# Altium footprint library ERNI SMD.PcbLib: 26 footprints (part 2 of 2)
Each footprint in its own frame and in the unit in brackets; x right, y up, seen from the top. Pads: shape width x height; smd on the part's side, far side on the other; paste and mask are expansions set on the pad; w line width, h text height; cw(c..) or ccw(c..) is an arc to the next point about the centre after c.
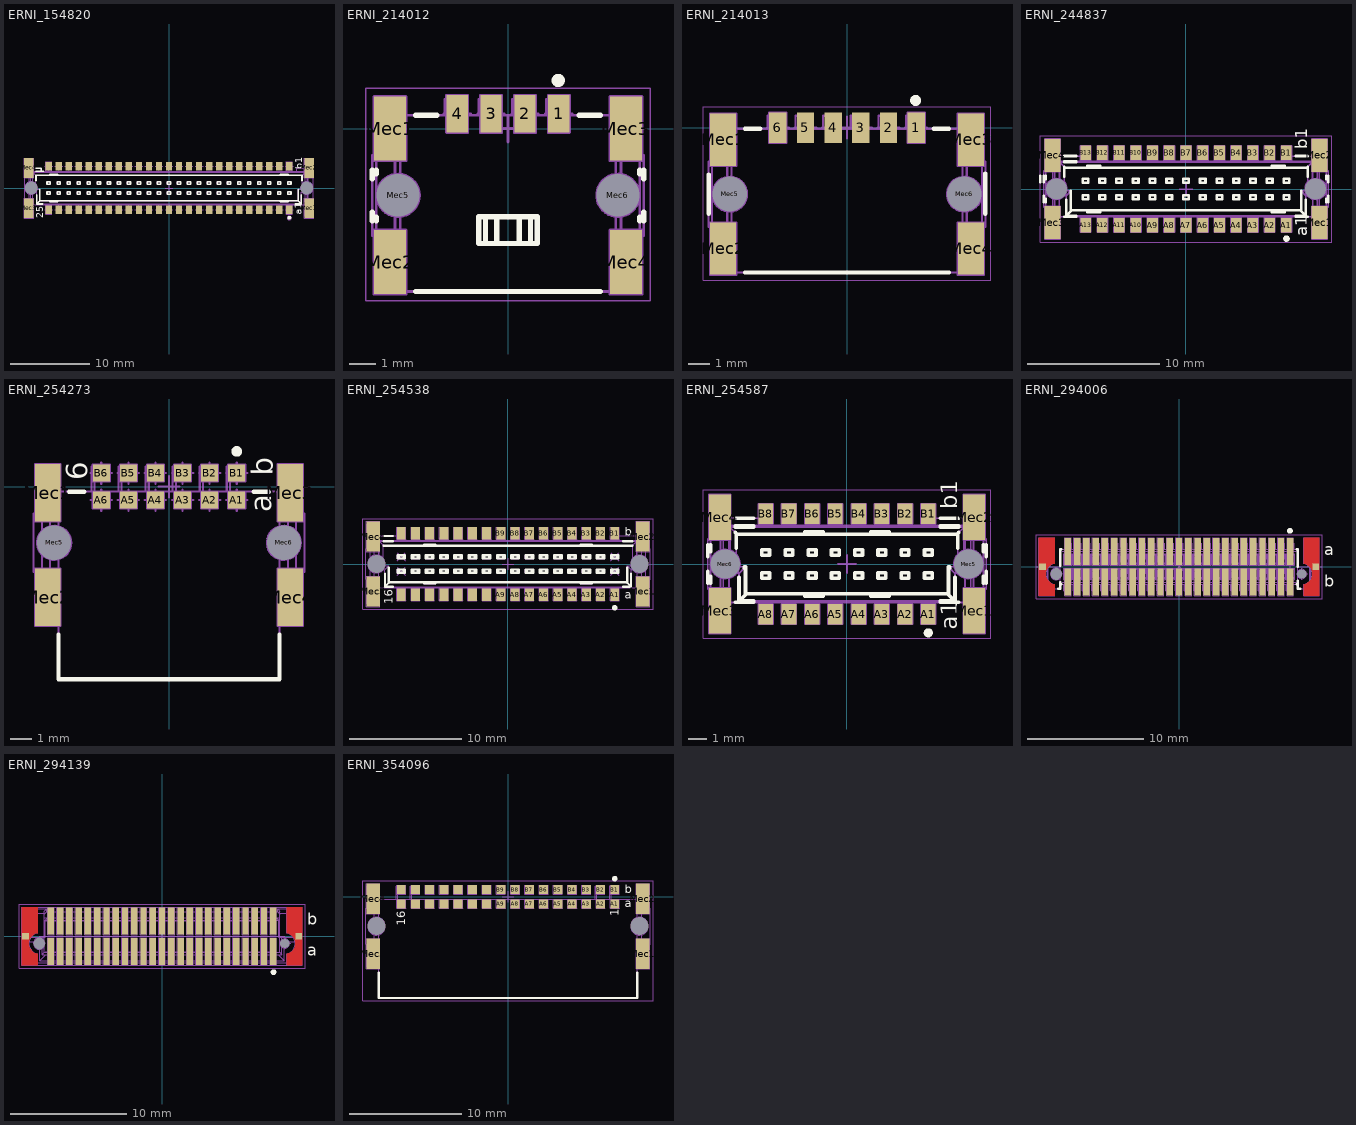
[diagram p1: the footprints below, top view; thin cyan lines are the x and y axes]

## ERNI_154820 [mm] "50 Contacts Pitch 1.27  SMC Straight Male Connector Type Q"
height 6.75
pads (56):
  rect 0.8x1.1 smd: A1(15.24,-2.75) A2(13.97,-2.75) A3(12.7,-2.75) A4(11.43,-2.75) A5(10.16,-2.75) A6(8.89,-2.75) A7(7.62,-2.75) A8(6.35,-2.75) A9(5.08,-2.75) A10(3.81,-2.75) A11(2.54,-2.75) A12(1.27,-2.75) A13(0,-2.75) A14(-1.27,-2.75) A15(-2.54,-2.75) A16(-3.81,-2.75) A17(-5.08,-2.75) A18(-6.35,-2.75) A19(-7.62,-2.75) A20(-8.89,-2.75) A21(-10.16,-2.75) A22(-11.43,-2.75) A23(-12.7,-2.75) A24(-13.97,-2.75) A25(-15.24,-2.75) B1(15.24,2.75) B2(13.97,2.75) B3(12.7,2.75) B4(11.43,2.75) B5(10.16,2.75) B6(8.89,2.75) B7(7.62,2.75) B8(6.35,2.75) B9(5.08,2.75) B10(3.81,2.75) B11(2.54,2.75) B12(1.27,2.75) B13(0,2.75) B14(-1.27,2.75) B15(-2.54,2.75) B16(-3.81,2.75) B17(-5.08,2.75) B18(-6.35,2.75) B19(-7.62,2.75) B20(-8.89,2.75) B21(-10.16,2.75) B22(-11.43,2.75) B23(-12.7,2.75) B24(-13.97,2.75) B25(-15.24,2.75)
  rect 1.2x2.5 smd: Mec1(17.752,-2.549) Mec2(17.752,2.549) Mec3(-17.752,-2.549) Mec4(-17.752,2.549)
  round 1 hole 1.6 unplated mask+0.3: Mec5(17.452,0) Mec6(-17.453,0)
Top Overlay:
  drawing of 229 lines, arcs and shapes, not listed
  text "25" at -15.95,-3.825 h0.9
  text "a1" at 16.828,-3.4 h0.9
  text "b1" at 16.852,2.4 h0.9
Mechanical 8:
  drawing of 262 lines, arcs and shapes, not listed
Mechanical 14:
  drawing of 291 lines, arcs and shapes, not listed
  text "b1" at 16.852,2.4 h0.9
  text "a1" at 16.825,-3.4 h0.9
  text "25" at -15.95,-3.825 h0.9
3D body "ERNI_154820.stp": height 6.75, standoff -0.75, extent -18.417,-3.6 18.403,3.6

## ERNI_214012 [mm] "4 Contacts, 1.27mm, Type A, Single Row Right Angle Male Connector, MiniBridge Cable System"
height 2.98
pads (10):
  rect 0.8x1.4 smd: 1(1.905,0.55) 2(0.635,0.55) 3(-0.635,0.55) 4(-1.905,0.55)
  rect 1.2x2.4 smd: Mec1(-4.415,0) Mec2(-4.415,-5) Mec3(4.415,0) Mec4(4.415,-5)
  round 1 hole 1.6 unplated mask+0.3: Mec5(-4.115,-2.5) Mec6(4.115,-2.5)
Top Overlay:
  circle w0.25: c1.88,1.8 r0.125
  lines w0.2: -5.08,-3.45 -5.08,-3.126 ; -5.08,-1.874 -5.08,-1.55 ; -4.93,-3.45 -4.93,-3.311 ; -4.93,-1.689 -4.93,-1.55 ; -3.465,-6.1 3.465,-6.1 ; -3.465,0.5 -2.655,0.5 ; -0.845,-4.3 -0.845,-3.3 ; -0.425,-4.3 -0.425,-3.3 ; 0.425,-4.3 0.425,-3.3 ; 0.845,-4.3 0.845,-3.3 ; 2.655,0.5 3.465,0.5 ; 4.93,-3.45 4.93,-3.311 ; 4.93,-1.689 4.93,-1.55 ; 5.08,-3.45 5.08,-3.126 ; 5.08,-1.874 5.08,-1.55 ; -1.1,-4.3 1.1,-4.3 1.1,-3.3 -1.1,-3.3 -1.1,-4.3
Mechanical 8:
  circle w0.1: c4.115,-2.5 r0.8
  circle w0.1: c-4.115,-2.5 r0.8
  lines w0.1: -4.915,-5 -4.415,-5 ; -4.915,0 -4.415,0 ; -4.615,-2.5 -4.115,-2.5 ; -4.415,-5.5 -4.415,-5 ; -4.415,-4.5 -4.415,-5 ; -4.415,-0.5 -4.415,0 ; -4.415,0.5 -4.415,0 ; -4.115,-3 -4.115,-2.5 ; -4.115,-2 -4.115,-2.5 ; -3.915,-5 -4.415,-5 ; -3.915,0 -4.415,0 ; -3.615,-2.5 -4.115,-2.5 ; -2.405,0.55 -1.905,0.55 ; -1.905,0.05 -1.905,0.55 ; -1.905,1.05 -1.905,0.55 ; -1.405,0.55 -1.905,0.55 ; -1.135,0.55 -0.635,0.55 ; -0.635,0.05 -0.635,0.55 ; -0.635,1.05 -0.635,0.55 ; -0.5,0 0,0 ; -0.135,0.55 -0.635,0.55 ; 0,-0.5 0,0 ; 0,0.5 0,0 ; 0.135,0.55 0.635,0.55 ; 0.5,0 0,0 ; 0.635,0.05 0.635,0.55 ; 0.635,1.05 0.635,0.55 ; 1.135,0.55 0.635,0.55 ; 1.405,0.55 1.905,0.55 ; 1.905,0.05 1.905,0.55 ; 1.905,1.05 1.905,0.55 ; 2.405,0.55 1.905,0.55 ; 3.615,-2.5 4.115,-2.5 ; 3.915,-5 4.415,-5 ; 3.915,0 4.415,0 ; 4.115,-3 4.115,-2.5 ; 4.115,-2 4.115,-2.5 ; 4.415,-5.5 4.415,-5 ; 4.415,-4.5 4.415,-5 ; 4.415,-0.5 4.415,0 ; 4.415,0.5 4.415,0 ; 4.615,-2.5 4.115,-2.5 ; 4.915,-5 4.415,-5 ; 4.915,0 4.415,0 ; -5.015,-6.2 -3.815,-6.2 -3.815,-3.8 -5.015,-3.8 -5.015,-6.2 ; -5.015,-1.2 -3.815,-1.2 -3.815,1.2 -5.015,1.2 -5.015,-1.2 ; -2.305,-0.15 -1.505,-0.15 -1.505,1.25 -2.305,1.25 -2.305,-0.15 ; -1.035,-0.15 -0.235,-0.15 -0.235,1.25 -1.035,1.25 -1.035,-0.15 ; 0.235,-0.15 1.035,-0.15 1.035,1.25 0.235,1.25 0.235,-0.15 ; 1.505,-0.15 2.305,-0.15 2.305,1.25 1.505,1.25 1.505,-0.15 ; 3.815,-6.2 5.015,-6.2 5.015,-3.8 3.815,-3.8 3.815,-6.2 ; 3.815,-1.2 5.015,-1.2 5.015,1.2 3.815,1.2 3.815,-1.2
Mechanical 14:
  lines w0.1: -4.93,-5.38 -4.63,-5.38 ; -4.93,-4.55 -4.23,-4.55 -4.23,-0.45 -4.93,-0.45 ; -4.93,-4 -5.08,-4 -5.08,-1 -4.93,-1 ; -4.93,0.38 -4.63,0.38 ; -4.63,-6 -4.93,-6 -4.93,1 -3.93,1 -3.93,0.5 ; -4.63,-4.55 -4.63,-6.1 4.63,-6.1 4.63,-4.55 ; -4.63,-0.45 -4.63,0.5 4.63,0.5 4.63,-0.45 ; -4.03,-6.1 -4.03,0.5 ; -2.37,0.5 -2.37,1.1 -1.65,1.1 -1.65,0.5 ; -2.22,0.5 -2.22,1.1 ; -1.1,0.5 -1.1,1.1 -0.38,1.1 -0.38,0.5 ; -0.95,0.5 -0.95,1.1 ; -0.845,-4.3 -0.845,-3.3 ; -0.425,-4.3 -0.425,-3.3 ; 0.17,0.5 0.17,1.1 0.89,1.1 0.89,0.5 ; 0.32,0.5 0.32,1.1 ; 0.425,-4.3 0.425,-3.3 ; 0.845,-4.3 0.845,-3.3 ; 1.44,0.5 1.44,1.1 2.16,1.1 2.16,0.5 ; 1.59,0.5 1.59,1.1 ; 3.93,0.5 3.93,1 4.93,1 4.93,-6 4.63,-6 ; 4.03,-6.1 4.03,0.5 ; 4.63,-5.38 4.93,-5.38 ; 4.63,0.38 4.93,0.38 ; 4.93,-4.55 4.23,-4.55 4.23,-0.45 4.93,-0.45 ; 4.93,-4 5.08,-4 5.08,-1 4.93,-1 ; -1.1,-4.3 1.1,-4.3 1.1,-3.3 -1.1,-3.3 -1.1,-4.3
Mechanical 15:
  lines w0.05: -5.33,-6.45 5.33,-6.45 5.33,1.5 -5.33,1.5 -5.33,-6.45
3D body "ERNI_214012.stp": height 2.98, standoff -0.75, extent -5.08,-6.1 5.08,1.1

## ERNI_214013 [mm] "6 Contacts, 1.27mm SRC Type A, Single Row Right Angle Male Connector, MiniBridge Cable System"
height 2.98
pads (12):
  rect 0.8x1.4 smd: 1(3.175,0) 2(1.905,0) 3(0.635,0) 4(-0.635,0) 5(-1.905,0) 6(-3.175,0)
  rect 1.2x2.4 smd: Mec1(-5.685,-0.55) Mec2(-5.685,-5.55) Mec3(5.685,-0.55) Mec4(5.685,-5.55)
  round 1 hole 1.6 unplated mask+0.3: Mec5(-5.385,-3.05) Mec6(5.385,-3.05)
Top Overlay:
  circle w0.25: c3.15,1.25 r0.125
  lines w0.2: -6.35,-3.95 -6.35,-2.15 ; -4.685,-6.65 4.685,-6.65 ; -4.685,-0.05 -3.975,-0.05 ; 3.975,-0.05 4.685,-0.05 ; 6.35,-3.95 6.35,-2.1
Mechanical 8:
  circle w0.1: c-5.385,-3.05 r0.8
  circle w0.1: c5.385,-3.05 r0.8
  lines w0.1: -6.185,-5.55 -5.685,-5.55 ; -6.185,-0.55 -5.685,-0.55 ; -5.885,-3.05 -5.385,-3.05 ; -5.685,-6.05 -5.685,-5.55 ; -5.685,-5.05 -5.685,-5.55 ; -5.685,-1.05 -5.685,-0.55 ; -5.685,-0.05 -5.685,-0.55 ; -5.385,-3.55 -5.385,-3.05 ; -5.385,-2.55 -5.385,-3.05 ; -5.185,-5.55 -5.685,-5.55 ; -5.185,-0.55 -5.685,-0.55 ; -4.885,-3.05 -5.385,-3.05 ; -3.675,0 -3.175,0 ; -3.175,-0.5 -3.175,0 ; -3.175,0.5 -3.175,0 ; -2.675,0 -3.175,0 ; -2.405,0 -1.905,0 ; -1.905,-0.5 -1.905,0 ; -1.905,0.5 -1.905,0 ; -1.405,0 -1.905,0 ; -1.135,0 -0.635,0 ; -0.635,-0.5 -0.635,0 ; -0.635,0.5 -0.635,0 ; -0.5,0 0,0 ; 0,-0.5 0,0 ; 0,0.5 0,0 ; 0.5,0 0,0 ; 0.635,-0.5 0.635,0 ; 0.635,0.5 0.635,0 ; 1.135,0 0.635,0 ; 1.405,0 1.905,0 ; 1.905,-0.5 1.905,0 ; 1.905,0.5 1.905,0 ; 2.405,0 1.905,0 ; 2.675,0 3.175,0 ; 3.175,-0.5 3.175,0 ; 3.175,0.5 3.175,0 ; 3.675,0 3.175,0 ; 4.885,-3.05 5.385,-3.05 ; 5.185,-5.55 5.685,-5.55 ; 5.185,-0.55 5.685,-0.55 ; 5.385,-3.55 5.385,-3.05 ; 5.385,-2.55 5.385,-3.05 ; 5.685,-6.05 5.685,-5.55 ; 5.685,-5.05 5.685,-5.55 ; 5.685,-1.05 5.685,-0.55 ; 5.685,-0.05 5.685,-0.55 ; 5.885,-3.05 5.385,-3.05 ; 6.185,-5.55 5.685,-5.55 ; 6.185,-0.55 5.685,-0.55 ; -6.285,-6.75 -5.085,-6.75 -5.085,-4.35 -6.285,-4.35 -6.285,-6.75 ; -6.285,-1.75 -5.085,-1.75 -5.085,0.65 -6.285,0.65 -6.285,-1.75 ; -3.575,-0.7 -3.575,0.7 -2.775,0.7 -2.775,-0.7 -3.575,-0.7 ; 2.775,-0.7 2.775,0.7 3.575,0.7 3.575,-0.7 2.775,-0.7 ; 5.085,-6.75 6.285,-6.75 6.285,-4.35 5.085,-4.35 5.085,-6.75 ; 5.085,-1.75 5.085,0.65 6.285,0.65 6.285,-1.75 5.085,-1.75
Mechanical 14:
  lines w0.1: -6.203,-4.55 -6.35,-4.55 -6.35,-1.55 -6.196,-1.55 ; -6.2,-5.1 -5.5,-5.1 -5.5,-1 -6.2,-1 ; -5.9,-6.18 -6.2,-6.18 -6.2,-6.65 -5.9,-6.65 ; -5.9,-5.93 -6.2,-5.93 -6.2,-0.17 -5.9,-0.17 ; -5.9,-5.1 -5.9,-6.65 ; -5.9,-1 -5.9,-0.05 5.9,-0.05 5.9,-1 ; -5.85,-0.05 -5.85,0.08 -6.2,0.08 -6.2,0.55 -5.2,0.55 -5.2,-0.05 ; -5.3,-6.65 -5.3,-0.05 ; -3.64,-0.05 -3.64,0.55 -3.02,0.55 cw(c-3.02,0.45) -2.92,0.45 -2.92,-0.05 ; -3.49,-0.05 -3.49,0.55 ; -2.37,-0.05 -2.37,0.55 -1.75,0.55 cw(c-1.75,0.45) -1.65,0.45 -1.65,-0.05 ; -2.22,-0.05 -2.22,0.55 ; -1.1,-0.05 -1.1,0.55 -0.48,0.55 cw(c-0.48,0.45) -0.38,0.45 -0.38,-0.05 ; -0.95,-0.05 -0.95,0.55 ; 0.17,-0.05 0.17,0.55 0.79,0.55 cw(c0.79,0.45) 0.89,0.45 0.89,-0.05 ; 0.32,-0.05 0.32,0.55 ; 1.44,-0.05 1.44,0.55 2.06,0.55 cw(c2.06,0.45) 2.16,0.45 2.16,-0.05 ; 1.59,-0.05 1.59,0.55 ; 2.71,-0.05 2.71,0.55 3.33,0.55 cw(c3.33,0.45) 3.43,0.45 3.43,-0.05 ; 2.86,-0.05 2.86,0.55 ; 5.2,-0.05 5.2,0.55 6.2,0.55 6.2,0.08 5.85,0.08 5.85,-0.05 ; 5.3,-6.65 5.3,-0.05 ; 5.9,-6.18 6.2,-6.18 6.2,-6.65 5.9,-6.65 ; 5.9,-5.93 6.2,-5.93 6.2,-0.17 5.9,-0.17 ; 5.9,-5.1 5.9,-6.65 ; 6.196,-1.55 6.35,-1.55 6.35,-4.55 6.203,-4.55 ; 6.2,-5.1 5.5,-5.1 5.5,-1 6.2,-1 ; -5.9,-6.65 5.9,-6.65
Mechanical 15:
  lines w0.05: -6.604,-7.004 -6.604,0.954 6.604,0.954 6.604,-7.004 -6.604,-7.004
3D body "ERNI_214013.stp": height 2.98, standoff -0.75, extent -6.35,-6.65 6.35,0.55

## ERNI_244837 [mm] "26 Contacts Pitch 1.27, SMC Straight Male Connector Type Q"
height 7.6
pads (32):
  rect 0.8x1.1 smd: A1(7.62,-2.75) A2(6.35,-2.75) A3(5.08,-2.75) A4(3.81,-2.75) A5(2.54,-2.75) A6(1.27,-2.75) A7(0,-2.75) A8(-1.27,-2.75) A9(-2.54,-2.75) A10(-3.81,-2.75) A11(-5.08,-2.75) A12(-6.35,-2.75) A13(-7.62,-2.75) B1(7.62,2.75) B2(6.35,2.75) B3(5.08,2.75) B4(3.81,2.75) B5(2.54,2.75) B6(1.27,2.75) B7(0,2.75) B8(-1.27,2.75) B9(-2.54,2.75) B10(-3.81,2.75) B11(-5.08,2.75) B12(-6.35,2.75) B13(-7.62,2.75)
  rect 1.2x2.5 smd: Mec1(10.13,-2.55) Mec2(10.13,2.55) Mec3(-10.13,-2.55) Mec4(-10.13,2.55)
  round 1 hole 1.6 unplated mask+0.3: Mec5(9.83,0) Mec6(-9.83,0)
Top Overlay:
  drawing of 156 lines, arcs and shapes, not listed
  text "a1" at 9.2,-3.6 h0.9
  text "b1" at 9.2,3 h0.9
Mechanical 8:
  drawing of 194 lines, arcs and shapes, not listed
Mechanical 14:
  drawing of 440 lines, arcs and shapes, not listed
  text "a1" at 9.2,-3.6 h0.9
  text "13" at -8.303,-3.775 h0.9
Mechanical 15:
  lines w0.05: -11.045,-4.05 -11.045,4.05 11.045,4.05 11.045,-4.05 -11.045,-4.05
3D body "ERNI_244837.stp": height 6.75, standoff -0.75, extent -10.795,-3.5 10.795,3.5

## ERNI_254273 [mm] "12 Contacts, Pitch 1.27, SMC Right Angle Male Connector Type B"
height 4.2
pads (18):
  rect 0.8x0.8 smd: A1(3.175,-0.635) A2(1.905,-0.635) A3(0.635,-0.635) A4(-0.635,-0.635) A5(-1.905,-0.635) A6(-3.175,-0.635) B1(3.175,0.635) B2(1.905,0.635) B3(0.635,0.635) B4(-0.635,0.635) B5(-1.905,0.635) B6(-3.175,0.635)
  rect 1.2x2.7 smd: Mec1(-5.685,-0.285) Mec2(-5.685,-5.185) Mec3(5.685,-0.285) Mec4(5.685,-5.185)
  round 1 hole 1.6 unplated mask+0.3: Mec5(-5.385,-2.635) Mec6(5.385,-2.635)
Top Overlay:
  circle w0.25: c3.175,1.651 r0.125
  lines w0.2: -5.185,-6.935 -5.185,-9.035 5.185,-9.035 5.185,-6.935 ; -4.685,-0.235 -3.975,-0.235 ; 3.975,-0.235 4.685,-0.235
  text "b" at 4.855,0.5 h1
  text "a" at 4.8,-1.2 h1
  text "6" at -3.845,0.3 h1
Mechanical 8:
  circle w0.1: c-5.385,-2.635 r0.8
  circle w0.1: c5.385,-2.635 r0.8
  lines w0.1: -6.185,-5.185 -5.685,-5.185 ; -6.185,-0.285 -5.685,-0.285 ; -5.885,-2.635 -5.385,-2.635 ; -5.685,-5.685 -5.685,-5.185 ; -5.685,-4.685 -5.685,-5.185 ; -5.685,-0.785 -5.685,-0.285 ; -5.685,0.215 -5.685,-0.285 ; -5.385,-3.135 -5.385,-2.635 ; -5.385,-2.135 -5.385,-2.635 ; -5.185,-5.185 -5.685,-5.185 ; -5.185,-0.285 -5.685,-0.285 ; -4.885,-2.635 -5.385,-2.635 ; -3.675,-0.635 -3.175,-0.635 ; -3.675,0.635 -3.175,0.635 ; -3.175,-1.135 -3.175,-0.635 ; -3.175,-0.135 -3.175,-0.635 ; -3.175,0.135 -3.175,0.635 ; -3.175,1.135 -3.175,0.635 ; -2.675,-0.635 -3.175,-0.635 ; -2.675,0.635 -3.175,0.635 ; -2.405,-0.635 -1.905,-0.635 ; -2.405,0.635 -1.905,0.635 ; -1.905,-1.135 -1.905,-0.635 ; -1.905,-0.135 -1.905,-0.635 ; -1.905,0.135 -1.905,0.635 ; -1.905,1.135 -1.905,0.635 ; -1.405,-0.635 -1.905,-0.635 ; -1.405,0.635 -1.905,0.635 ; -1.135,-0.635 -0.635,-0.635 ; -1.135,0.635 -0.635,0.635 ; -0.635,-1.135 -0.635,-0.635 ; -0.635,-0.135 -0.635,-0.635 ; -0.635,0.135 -0.635,0.635 ; -0.635,1.135 -0.635,0.635 ; -0.5,0 0,0 ; -0.135,-0.635 -0.635,-0.635 ; -0.135,0.635 -0.635,0.635 ; 0,-0.5 0,0 ; 0,0.5 0,0 ; 0.135,-0.635 0.635,-0.635 ; 0.135,0.635 0.635,0.635 ; 0.5,0 0,0 ; 0.635,-1.135 0.635,-0.635 ; 0.635,-0.135 0.635,-0.635 ; 0.635,0.135 0.635,0.635 ; 0.635,1.135 0.635,0.635 ; 1.135,-0.635 0.635,-0.635 ; 1.135,0.635 0.635,0.635 ; 1.405,-0.635 1.905,-0.635 ; 1.405,0.635 1.905,0.635 ; 1.905,-1.135 1.905,-0.635 ; 1.905,-0.135 1.905,-0.635 ; 1.905,0.135 1.905,0.635 ; 1.905,1.135 1.905,0.635 ; 2.405,-0.635 1.905,-0.635 ; 2.405,0.635 1.905,0.635 ; 2.675,-0.635 3.175,-0.635 ; 2.675,0.635 3.175,0.635 ; 3.175,-1.135 3.175,-0.635 ; 3.175,-0.135 3.175,-0.635 ; 3.175,0.135 3.175,0.635 ; 3.175,1.135 3.175,0.635 ; 3.675,-0.635 3.175,-0.635 ; 3.675,0.635 3.175,0.635 ; 4.885,-2.635 5.385,-2.635 ; 5.185,-5.185 5.685,-5.185 ; 5.185,-0.285 5.685,-0.285 ; 5.385,-3.135 5.385,-2.635 ; 5.385,-2.135 5.385,-2.635 ; 5.685,-5.685 5.685,-5.185 ; 5.685,-4.685 5.685,-5.185 ; 5.685,-0.785 5.685,-0.285 ; 5.685,0.215 5.685,-0.285 ; 5.885,-2.635 5.385,-2.635 ; 6.185,-5.185 5.685,-5.185 ; 6.185,-0.285 5.685,-0.285 ; -6.285,-6.535 -5.085,-6.535 -5.085,-3.835 -6.285,-3.835 -6.285,-6.535 ; -6.285,-1.635 -6.285,1.065 -5.085,1.065 -5.085,-1.635 -6.285,-1.635 ; -3.575,-1.035 -2.775,-1.035 -2.775,-0.235 -3.575,-0.235 -3.575,-1.035 ; -3.575,0.235 -2.775,0.235 -2.775,1.035 -3.575,1.035 -3.575,0.235 ; -2.305,-1.035 -1.505,-1.035 -1.505,-0.235 -2.305,-0.235 -2.305,-1.035 ; -2.305,0.235 -1.505,0.235 -1.505,1.035 -2.305,1.035 -2.305,0.235 ; -1.035,-1.035 -0.235,-1.035 -0.235,-0.235 -1.035,-0.235 -1.035,-1.035 ; -1.035,0.235 -0.235,0.235 -0.235,1.035 -1.035,1.035 -1.035,0.235 ; 0.235,-1.035 1.035,-1.035 1.035,-0.235 0.235,-0.235 0.235,-1.035 ; 0.235,0.235 1.035,0.235 1.035,1.035 0.235,1.035 0.235,0.235 ; 1.505,-1.035 2.305,-1.035 2.305,-0.235 1.505,-0.235 1.505,-1.035 ; 1.505,0.235 2.305,0.235 2.305,1.035 1.505,1.035 1.505,0.235 ; 2.775,-1.035 3.575,-1.035 3.575,-0.235 2.775,-0.235 2.775,-1.035 ; 2.775,0.235 3.575,0.235 3.575,1.035 2.775,1.035 2.775,0.235 ; 5.085,-6.535 6.285,-6.535 6.285,-3.835 5.085,-3.835 5.085,-6.535 ; 5.085,-1.635 5.085,1.065 6.285,1.065 6.285,-1.635 5.085,-1.635
Mechanical 14:
  drawing of 628 lines, arcs and shapes, not listed
  text "a" at 4.8,-1.2 h1
  text "b" at 4.855,0.5 h1
  text "a1" at 2.7,-2.8 h1
  text "a6" at -4,-2.8 h1
  text "6" at -3.845,0.3 h1
3D body "ERNI_254273.stp": height 4.25, standoff -0.75, extent -6.35,-9.035 6.35,0.965

## ERNI_254538 [mm] "32 Contacts Pitch 1.27, SMC Straight Male Connector Type Q"
height 8.25
pads (38):
  rect 0.8x1.1 smd: A1(9.525,-2.75) A2(8.255,-2.75) A3(6.985,-2.75) A4(5.715,-2.75) A5(4.445,-2.75) A6(3.175,-2.75) A7(1.905,-2.75) A8(0.635,-2.75) A9(-0.635,-2.75) A10(-1.905,-2.75) A11(-3.175,-2.75) A12(-4.445,-2.75) A13(-5.715,-2.75) A14(-6.985,-2.75) A15(-8.255,-2.75) A16(-9.525,-2.75) B1(9.525,2.75) B2(8.255,2.75) B3(6.985,2.75) B4(5.715,2.75) B5(4.445,2.75) B6(3.175,2.75) B7(1.905,2.75) B8(0.635,2.75) B9(-0.635,2.75) B10(-1.905,2.75) B11(-3.175,2.75) B12(-4.445,2.75) B13(-5.715,2.75) B14(-6.985,2.75) B15(-8.255,2.75) B16(-9.525,2.75)
  rect 1.2x2.7 smd: Mec1(12.035,-2.45) Mec2(12.035,2.45) Mec3(-12.035,-2.45) Mec4(-12.035,2.45)
  round 1 hole 1.6 unplated mask+0.3: Mec5(11.735,0) Mec6(-11.735,0)
Top Overlay:
  drawing of 218 lines, arcs and shapes, not listed
  text "16" at -10.3,-3.6 h0.75
  text "a" at 10.4,-3.1 h0.75
  text "b" at 10.4,2.5 h0.75
Mechanical 8:
  drawing of 254 lines, arcs and shapes, not listed
Mechanical 14:
  drawing of 496 lines, arcs and shapes, not listed
  text "16" at -10.3,-3.6 h0.75
  text "b" at 10.4,2.5 h0.75
  text "a" at 10.4,-3.1 h0.75
Mechanical 15:
  lines w0.05: -12.95,-4.05 12.95,-4.05 12.95,4.05 -12.95,4.05 -12.95,-4.05
3D body "ERNI_254538.stp": height 8.25, standoff -0.75, extent -12.7,-3.6 12.7,3.6

## ERNI_254587 [mm] "16 Contacts Pitch 1.27, SMC Straight Male Connector Type Q"
height 7.6
pads (22):
  rect 0.8x1.1 smd: A1(4.445,-2.75) A2(3.175,-2.75) A3(1.905,-2.75) A4(0.635,-2.75) A5(-0.635,-2.75) A6(-1.905,-2.75) A7(-3.175,-2.75) A8(-4.445,-2.75) B1(4.445,2.75) B2(3.175,2.75) B3(1.905,2.75) B4(0.635,2.75) B5(-0.635,2.75) B6(-1.905,2.75) B7(-3.175,2.75) B8(-4.445,2.75)
  rect 1.2x2.5 smd: Mec1(6.955,-2.55) Mec2(6.955,2.55) Mec3(-6.955,-2.55) Mec4(-6.955,2.55)
  round 1 hole 1.6 unplated mask+0.3: Mec5(6.655,0) Mec6(-6.655,0)
Top Overlay:
  circle w0.25: c4.447,-3.766 r0.125
  lines w0.2: -7.62,-1.05 -7.62,-0.414 ; -7.62,0.414 -7.62,1.05 ; -7.47,-1.05 -7.47,-0.662 ; -7.47,0.662 -7.47,1.05 ; -6.105,-2.1 -5.095,-2.1 ; -6.105,1.725 -6.055,1.675 -6.055,0.862 ; -6.105,2.025 -5.095,2.025 ; -6.105,2.1 -5.095,2.1 ; -6.105,2.5 -5.095,2.5 ; -6.055,1.625 -2.3,1.625 ; -5.905,-0.735 -5.905,-2.025 ; -5.629,-0.224 -5.555,-0.15 ; -5.616,-0.15 -5.555,-0.15 ; -5.555,-1.625 -2.3,-1.625 ; -5.095,-2.025 -5.905,-2.025 ; 5.095,-2.1 6.105,-2.1 ; 5.095,-2.025 5.905,-2.025 ; 5.095,2.025 6.105,2.025 ; 5.095,2.1 6.105,2.1 ; 5.095,2.5 6.105,2.5 ; 5.555,-1.625 2.3,-1.625 ; 5.616,-0.15 5.555,-0.15 ; 5.629,-0.224 5.555,-0.15 ; 5.905,-0.735 5.905,-2.025 ; 6.055,0.862 6.055,1.675 6.105,1.725 ; 6.055,1.625 2.3,1.625 ; 7.47,-1.05 7.47,-0.662 ; 7.47,0.662 7.47,1.05 ; 7.62,-1.05 7.62,-0.414 ; 7.62,0.414 7.62,1.05 ; -5.905,-2.025 -5.555,-1.675 -5.555,-0.15 ; -2.3,-1.625 -2.3,-1.75 -1.3,-1.75 -1.3,-1.625 ; -2.3,-1.625 -1.3,-1.625 ; -2.3,1.625 -2.3,1.75 -1.3,1.75 -1.3,1.625 ; -2.3,1.625 -1.3,1.625 ; -1.3,-1.625 1.3,-1.625 ; -1.3,1.625 1.3,1.625 ; 1.3,-1.625 1.3,-1.75 2.3,-1.75 2.3,-1.625 ; 1.3,-1.625 2.3,-1.625 ; 1.3,1.625 1.3,1.75 2.3,1.75 2.3,1.625 ; 1.3,1.625 2.3,1.625 ; 5.555,-0.15 5.555,-1.675 5.905,-2.025 ; -4.655,-0.785 -4.655,-0.485 -4.235,-0.485 -4.235,-0.785 -4.655,-0.785 ; -4.655,0.485 -4.655,0.785 -4.235,0.785 -4.235,0.485 -4.655,0.485 ; -3.385,-0.785 -3.385,-0.485 -2.965,-0.485 -2.965,-0.785 -3.385,-0.785 ; -3.385,0.485 -3.385,0.785 -2.965,0.785 -2.965,0.485 -3.385,0.485 ; -2.115,-0.785 -2.115,-0.485 -1.695,-0.485 -1.695,-0.785 -2.115,-0.785 ; -2.115,0.485 -2.115,0.785 -1.695,0.785 -1.695,0.485 -2.115,0.485 ; -0.845,-0.785 -0.845,-0.485 -0.425,-0.485 -0.425,-0.785 -0.845,-0.785 ; -0.845,0.485 -0.845,0.785 -0.425,0.785 -0.425,0.485 -0.845,0.485 ; 0.425,-0.785 0.425,-0.485 0.845,-0.485 0.845,-0.785 0.425,-0.785 ; 0.425,0.485 0.425,0.785 0.845,0.785 0.845,0.485 0.425,0.485 ; 1.695,-0.785 1.695,-0.485 2.115,-0.485 2.115,-0.785 1.695,-0.785 ; 1.695,0.485 1.695,0.785 2.115,0.785 2.115,0.485 1.695,0.485 ; 2.965,-0.785 2.965,-0.485 3.385,-0.485 3.385,-0.785 2.965,-0.785 ; 2.965,0.485 2.965,0.785 3.385,0.785 3.385,0.485 2.965,0.485 ; 4.235,-0.785 4.235,-0.485 4.655,-0.485 4.655,-0.785 4.235,-0.785 ; 4.235,0.485 4.235,0.785 4.655,0.785 4.655,0.485 4.235,0.485
  text "a1" at 6.025,-3.6 h0.9
  text "b1" at 6.025,3 h0.9
Mechanical 8:
  circle w0.1: c-6.655,0 r0.8
  circle w0.1: c6.655,0 r0.8
  lines w0.1: -7.155,0 -6.655,0 ; -6.655,-0.5 -6.655,0 ; -6.655,0.5 -6.655,0 ; -6.155,0 -6.655,0 ; 6.155,0 6.655,0 ; 6.655,-0.5 6.655,0 ; 6.655,0.5 6.655,0 ; 7.155,0 6.655,0 ; -7.555,-3.8 -6.955,-2.55 -6.355,-3.8 ; -7.555,-3.8 -7.555,-1.3 -6.355,-1.3 -6.355,-3.8 ; -7.555,-3.8 -6.355,-3.8 ; -7.555,3.8 -6.955,2.55 -6.355,3.8 ; -7.555,3.8 -7.555,1.3 -6.355,1.3 -6.355,3.8 ; -7.555,3.8 -6.355,3.8 ; -4.845,-3.3 -4.445,-2.75 -4.045,-3.3 ; -4.845,-3.3 -4.845,-2.2 -4.045,-2.2 -4.045,-3.3 ; -4.845,-3.3 -4.045,-3.3 ; -4.845,3.3 -4.445,2.75 -4.045,3.3 ; -4.845,3.3 -4.845,2.2 -4.045,2.2 -4.045,3.3 ; -4.845,3.3 -4.045,3.3 ; -3.575,-3.3 -3.175,-2.75 -2.775,-3.3 ; -3.575,-3.3 -3.575,-2.2 -2.775,-2.2 -2.775,-3.3 ; -3.575,-3.3 -2.775,-3.3 ; -3.575,3.3 -3.175,2.75 -2.775,3.3 ; -3.575,3.3 -3.575,2.2 -2.775,2.2 -2.775,3.3 ; -3.575,3.3 -2.775,3.3 ; -2.305,-3.3 -1.905,-2.75 -1.505,-3.3 ; -2.305,-3.3 -2.305,-2.2 -1.505,-2.2 -1.505,-3.3 ; -2.305,-3.3 -1.505,-3.3 ; -2.305,3.3 -1.905,2.75 -1.505,3.3 ; -2.305,3.3 -2.305,2.2 -1.505,2.2 -1.505,3.3 ; -2.305,3.3 -1.505,3.3 ; -1.035,-3.3 -0.635,-2.75 -0.235,-3.3 ; -1.035,-3.3 -1.035,-2.2 -0.235,-2.2 -0.235,-3.3 ; -1.035,-3.3 -0.235,-3.3 ; -1.035,3.3 -0.635,2.75 -0.235,3.3 ; -1.035,3.3 -1.035,2.2 -0.235,2.2 -0.235,3.3 ; -1.035,3.3 -0.235,3.3 ; 0,0 0.5,0 0,0 ; 0,0 0,-0.5 0,0 ; 0,0 0,0.5 0,0 ; 0,0 -0.5,0 0,0 ; 0.235,-3.3 0.635,-2.75 1.035,-3.3 ; 0.235,-3.3 0.235,-2.2 1.035,-2.2 1.035,-3.3 ; 0.235,-3.3 1.035,-3.3 ; 0.235,3.3 0.635,2.75 1.035,3.3 ; 0.235,3.3 0.235,2.2 1.035,2.2 1.035,3.3 ; 0.235,3.3 1.035,3.3 ; 1.505,-3.3 1.905,-2.75 2.305,-3.3 ; 1.505,-3.3 1.505,-2.2 2.305,-2.2 2.305,-3.3 ; 1.505,-3.3 2.305,-3.3 ; 1.505,3.3 1.905,2.75 2.305,3.3 ; 1.505,3.3 1.505,2.2 2.305,2.2 2.305,3.3 ; 1.505,3.3 2.305,3.3 ; 2.775,-3.3 3.175,-2.75 3.575,-3.3 ; 2.775,-3.3 2.775,-2.2 3.575,-2.2 3.575,-3.3 ; 2.775,-3.3 3.575,-3.3 ; 2.775,3.3 3.175,2.75 3.575,3.3 ; 2.775,3.3 2.775,2.2 3.575,2.2 3.575,3.3 ; 2.775,3.3 3.575,3.3 ; 4.045,-3.3 4.445,-2.75 4.845,-3.3 ; 4.045,-3.3 4.045,-2.2 4.845,-2.2 4.845,-3.3 ; 4.045,-3.3 4.845,-3.3 ; 4.045,3.3 4.445,2.75 4.845,3.3 ; 4.045,3.3 4.045,2.2 4.845,2.2 4.845,3.3 ; 4.045,3.3 4.845,3.3 ; 6.355,-3.8 6.955,-2.55 7.555,-3.8 ; 6.355,-3.8 6.355,-1.3 7.555,-1.3 7.555,-3.8 ; 6.355,-3.8 7.555,-3.8 ; 6.355,3.8 6.955,2.55 7.555,3.8 ; 6.355,3.8 6.355,1.3 7.555,1.3 7.555,3.8 ; 6.355,3.8 7.555,3.8
Mechanical 14:
  drawing of 330 lines, arcs and shapes, not listed
  text "8" at -5.1,-3.1 h0.9
  text "a1" at 6.025,-3.6 h0.9
Mechanical 15:
  lines w0.05: -7.87,-4.05 -7.87,4.05 7.87,4.05 7.87,-4.05 -7.87,-4.05
3D body "ERNI_254587.stp": height 6.75, standoff -0.75, extent -7.62,-3.5 7.62,3.5

## ERNI_294006 [mm] "50 Contacts Pitch 0.8  SMT Vertical Female Connector Type MicroCon"
height 4
pads (54):
  rect 0.55x2.35 smd: A1(9.6,1.325) A2(8.8,1.325) A3(8,1.325) A4(7.2,1.325) A5(6.4,1.325) A6(5.6,1.325) A7(4.8,1.325) A8(4,1.325) A9(3.2,1.325) A10(2.4,1.325) A11(1.6,1.325) A12(0.8,1.325) A13(0,1.325) A14(-0.8,1.325) A15(-1.6,1.325) A16(-2.4,1.325) A17(-3.2,1.325) A18(-4,1.325) A19(-4.8,1.325) A20(-5.6,1.325) A21(-6.4,1.325) A22(-7.2,1.325) A23(-8,1.325) A24(-8.8,1.325) A25(-9.6,1.325) B1(9.6,-1.325) B2(8.8,-1.325) B3(8,-1.325) B4(7.2,-1.325) B5(6.4,-1.325) B6(5.6,-1.325) B7(4.8,-1.325) B8(4,-1.325) B9(3.2,-1.325) B10(2.4,-1.325) B11(1.6,-1.325) B12(0.8,-1.325) B13(0,-1.325) B14(-0.8,-1.325) B15(-1.6,-1.325) B16(-2.4,-1.325) B17(-3.2,-1.325) B18(-4,-1.325) B19(-4.8,-1.325) B20(-5.6,-1.325) B21(-6.4,-1.325) B22(-7.2,-1.325) B23(-8,-1.325) B24(-8.8,-1.325) B25(-9.6,-1.325)
  rect 0.6x0.6 smd: MEC1(-11.8,0) MEC2(11.8,0)
  round 0.5 hole 0.8 unplated mask+0.15: Mec5(10.6,-0.625)
  round 0.5 hole 1 unplated mask+0.25: Mec6(-10.6,-0.625)
Top Layer:
  region: 10.75,-2.5 12.1,-2.5 12.1,2.5 10.75,2.5 10.75,0.262 10.853,0.239 11.046,0.157 11.215,0.032 11.351,-0.128 11.445,-0.316 11.494,-0.52 11.494,-0.73 11.445,-0.934 11.351,-1.122 11.215,-1.282 11.046,-1.407 10.853,-1.489 10.75,-1.512
  region: -12.1,-2.5 -10.75,-2.5 -10.75,-1.512 -10.852,-1.489 -11.046,-1.407 -11.215,-1.282 -11.35,-1.122 -11.445,-0.934 -11.494,-0.73 -11.494,-0.52 -11.445,-0.316 -11.35,-0.128 -11.215,0.032 -11.046,0.157 -10.852,0.239 -10.75,0.262 -10.75,2.5 -12.1,2.5
Top Overlay:
  circle w0.25: c9.575,3.101 r0.125
  lines w0.2: -10.45,-1.9 -10.25,-1.9 -10.25,-1.35 ; -10.25,-1.5 -10.175,-1.5 ; -10.25,0.1 -10.25,1.5 -10.175,1.5 ; 10.175,-1.5 10.25,-1.5 ; 10.175,1.5 10.25,1.5 10.25,0 ; 10.25,-1.2 10.25,-1.9 10.45,-1.9
  text "a" at 12.55,1 h1
  text "b" at 12.525,-1.705 h1
Mechanical 8:
  drawing of 338 lines, arcs and shapes, not listed
Mechanical 14:
  drawing of 978 lines, arcs and shapes, not listed
  text "a" at 12.55,1 h1
  text "b" at 12.525,-1.705 h1
Mechanical 15:
  lines w0.05: -12.35,-2.75 -12.35,2.75 12.35,2.75 12.35,-2.75 -12.35,-2.75
3D body "ERNI_294006.stp": height 4.6, standoff -0.7, extent -11.95,-2.35 11.95,2.35

## ERNI_294139 [mm] "50 Contacts Pitch 0.8  SMT Vertical Male Connector Type MicroCon"
height 4.8
pads (54):
  rect 0.55x2.35 smd: A1(9.6,-1.325) A2(8.8,-1.325) A3(8,-1.325) A4(7.2,-1.325) A5(6.4,-1.325) A6(5.6,-1.325) A7(4.8,-1.325) A8(4,-1.325) A9(3.2,-1.325) A10(2.4,-1.325) A11(1.6,-1.325) A12(0.8,-1.325) A13(0,-1.325) A14(-0.8,-1.325) A15(-1.6,-1.325) A16(-2.4,-1.325) A17(-3.2,-1.325) A18(-4,-1.325) A19(-4.8,-1.325) A20(-5.6,-1.325) A21(-6.4,-1.325) A22(-7.2,-1.325) A23(-8,-1.325) A24(-8.8,-1.325) A25(-9.6,-1.325) B1(9.6,1.325) B2(8.8,1.325) B3(8,1.325) B4(7.2,1.325) B5(6.4,1.325) B6(5.6,1.325) B7(4.8,1.325) B8(4,1.325) B9(3.2,1.325) B10(2.4,1.325) B11(1.6,1.325) B12(0.8,1.325) B13(0,1.325) B14(-0.8,1.325) B15(-1.6,1.325) B16(-2.4,1.325) B17(-3.2,1.325) B18(-4,1.325) B19(-4.8,1.325) B20(-5.6,1.325) B21(-6.4,1.325) B22(-7.2,1.325) B23(-8,1.325) B24(-8.8,1.325) B25(-9.6,1.325)
  rect 0.6x0.6 smd: MEC1(-11.8,0) MEC2(11.8,0)
  round 0.5 hole 0.8 unplated mask+0.15: Mec5(10.6,-0.625)
  round 0.5 hole 1 unplated mask+0.25: Mec6(-10.6,-0.625)
Top Layer:
  region: 10.75,-2.5 12.1,-2.5 12.1,2.5 10.75,2.5 10.75,0.262 10.853,0.239 11.046,0.157 11.215,0.032 11.351,-0.128 11.445,-0.316 11.494,-0.52 11.494,-0.73 11.445,-0.934 11.351,-1.122 11.215,-1.282 11.046,-1.407 10.853,-1.489 10.75,-1.512
  region: -12.1,-2.5 -10.75,-2.5 -10.75,-1.512 -10.852,-1.489 -11.046,-1.407 -11.215,-1.282 -11.35,-1.122 -11.445,-0.934 -11.494,-0.73 -11.494,-0.52 -11.445,-0.316 -11.35,-0.128 -11.215,0.032 -11.046,0.157 -10.852,0.239 -10.75,0.262 -10.75,2.5 -12.1,2.5
Top Overlay:
  circle w0.25: c9.625,-3.101 r0.125
  text "b" at 12.55,1 h1
  text "a" at 12.525,-1.705 h1
Mechanical 8:
  drawing of 377 lines, arcs and shapes, not listed
Mechanical 14:
  drawing of 256 lines, arcs and shapes, not listed
  text "b" at 12.55,1 h1
  text "a" at 12.525,-1.705 h1
Mechanical 15:
  lines w0.05: -12.35,-2.75 12.35,-2.75 12.35,2.75 -12.35,2.75 -12.35,-2.75
3D body "ERNI_294139.stp": height 4.8, standoff -0.7, extent -12.1,-2.5 12.1,2.5

## ERNI_354096 [mm] "32 Contacts Pitch 1.27 SMC Right Angle Male Connector Type B"
height 4.25
pads (38):
  rect 0.8x0.8 smd: A1(9.525,-0.635) A2(8.255,-0.635) A3(6.985,-0.635) A4(5.715,-0.635) A5(4.445,-0.635) A6(3.175,-0.635) A7(1.905,-0.635) A8(0.635,-0.635) A9(-0.635,-0.635) A10(-1.905,-0.635) A11(-3.175,-0.635) A12(-4.445,-0.635) A13(-5.715,-0.635) A14(-6.985,-0.635) A15(-8.255,-0.635) A16(-9.525,-0.635) B1(9.525,0.635) B2(8.255,0.635) B3(6.985,0.635) B4(5.715,0.635) B5(4.445,0.635) B6(3.175,0.635) B7(1.905,0.635) B8(0.635,0.635) B9(-0.635,0.635) B10(-1.905,0.635) B11(-3.175,0.635) B12(-4.445,0.635) B13(-5.715,0.635) B14(-6.985,0.635) B15(-8.255,0.635) B16(-9.525,0.635)
  rect 1.2x2.7 smd: Mec1(12.035,-5.085) Mec2(12.035,-0.185) Mec3(-12.035,-5.085) Mec4(-12.035,-0.185)
  round 1 hole 1.6 unplated mask+0.3: Mec5(11.735,-2.635) Mec6(-11.735,-2.635)
Top Overlay:
  circle w0.25: c9.525,1.605 r0.125
  lines w0.2: -11.535,-6.785 -11.535,-9.035 11.535,-9.035 11.535,-6.785
  text "b" at 10.4,0.3 h0.75
  text "a" at 10.4,-0.955 h0.75
  text "16" at -9.15,-2.6 h0.75
  text "1" at 9.9,-1.75 h0.75
Mechanical 8:
  drawing of 238 lines, arcs and shapes, not listed
Mechanical 14:
  lines w0.1: -12.586,-4.235 -12.586,-6.235 -11.535,-6.235 ; -12.586,-1.035 -12.586,0.965 -11.536,0.965 -11.536,-0.235 ; -11.936,-4.235 -12.7,-4.235 -12.7,-1.035 -11.936,-1.035 ; -11.886,-4.735 ccw(c-11.886,-4.885) -11.886,-5.035 -11.535,-5.035 ; -11.886,-0.535 cw(c-11.886,-0.385) -11.886,-0.235 -11.536,-0.235 ; -11.535,-4.735 -11.936,-4.735 -11.936,-0.535 -11.535,-0.535 ; -9.99,-0.235 -9.99,0.935 -9.27,0.935 -9.27,0.335 -9.84,0.335 ; -9.84,-0.235 -9.84,0.935 ; -8.72,-0.235 -8.72,0.935 -8,0.935 -8,0.335 -8.57,0.335 ; -8.57,-0.235 -8.57,0.935 ; 7.79,-0.235 7.79,0.935 8.51,0.935 8.51,0.335 7.94,0.335 ; 7.94,-0.235 7.94,0.935 ; 9.06,-0.235 9.06,0.935 9.78,0.935 9.78,0.335 9.21,0.335 ; 9.21,-0.235 9.21,0.935 ; 11.535,-6.235 12.586,-6.235 12.586,-4.235 ; 11.535,-5.035 11.886,-5.035 ccw(c11.886,-4.885) 11.886,-4.735 ; 11.535,-4.735 11.936,-4.735 11.936,-0.535 11.535,-0.535 ; 11.886,-0.535 ccw(c11.886,-0.385) 11.886,-0.235 11.536,-0.235 ; 11.936,-4.235 12.7,-4.235 12.7,-1.035 11.936,-1.035 ; 12.586,-1.035 12.586,0.965 11.536,0.965 11.536,-0.235 ; -11.535,-0.235 11.535,-0.235 ; -11.535,-0.235 -11.535,-9.035 11.535,-9.035 11.535,-0.235
  text "a" at 10.4,-0.955 h0.75
  text "b" at 10.4,0.3 h0.75
  text "16" at -9.15,-2.6 h0.75
  text "1" at 9.9,-1.75 h0.75
Mechanical 15:
  lines w0.05: -12.95,-9.285 12.95,-9.285 12.95,1.415 -12.95,1.415 -12.95,-9.285
3D body "ERNI_354096.stp": height 4.25, standoff -0.75, extent -12.7,-9.035 12.7,0.965